# Altium footprint library IND_SMD.PcbLib: 118 footprints (part 8 of 8)
Each footprint in its own frame and in the unit in brackets; x right, y up, seen from the top. Pads: shape width x height; smd on the part's side, far side on the other; paste and mask are expansions set on the pad; w line width, h text height; cw(c..) or ccw(c..) is an arc to the next point about the centre after c.
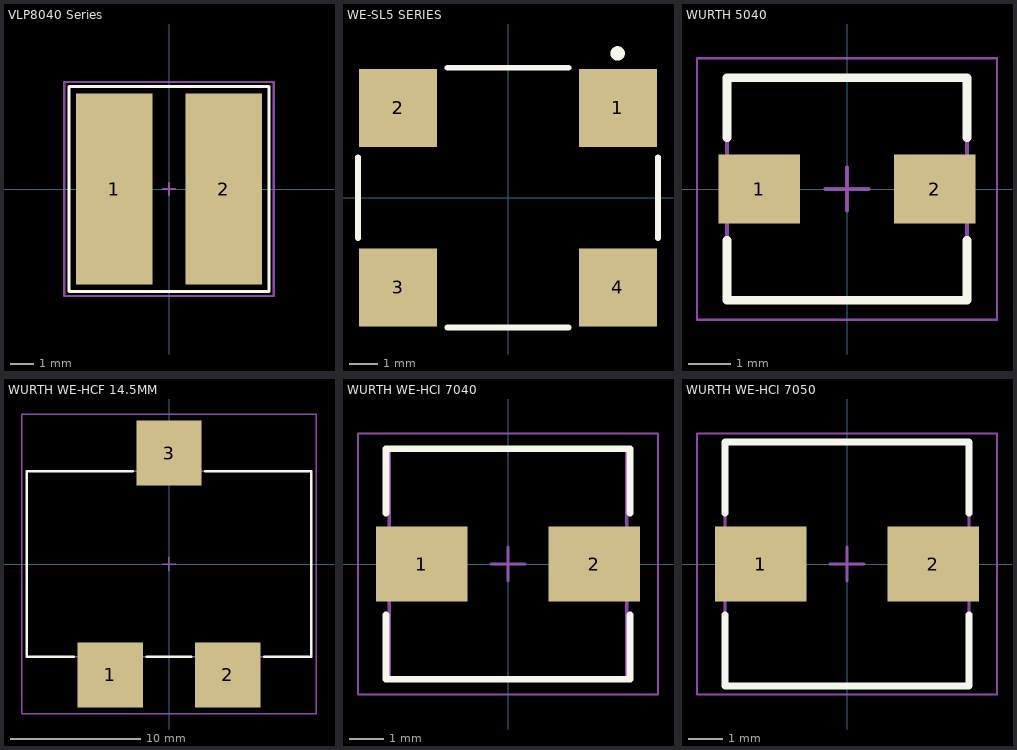
[diagram p7: the footprints below, top view; thin cyan lines are the x and y axes]

## VLP8040 Series [mm]
height 4
pads (2):
  rect 3.3x8.2 smd: 1(-2.35,0) 2(2.35,0)
Top Overlay:
  lines w0.127: -4.3,-4.4 4.3,-4.4 4.3,4.4 -4.3,4.4 -4.3,-4.4
Mechanical 15:
  lines w0.1: -0.25,0 0.25,0 ; 0,-0.25 0,0.25 ; -4.5,-4.6 4.5,-4.6 4.5,4.6 -4.5,4.6 -4.5,-4.6
3D body "VLP8040T.STEP": height 4.2, standoff 0, extent -3.75,-3.95 3.75,3.95

## WE-SL5 SERIES [mm]
pads (4):
  rect 2.7x2.7 smd: 1(3.81,3.11) 2(-3.81,3.11) 3(-3.81,-3.11) 4(3.81,-3.11)
Top Overlay:
  circle w0.3: c3.8,5 r0.1
  lines w0.2: -5.2,-1.4 -5.2,1.4 ; -2.1,-4.5 2.1,-4.5 ; -2.1,4.5 2.1,4.5 ; 5.2,-1.4 5.2,1.4
3D body "744272251.stp": height 6, standoff 0, extent -5,-4.35 5,4.35

## WURTH 5040 [mm] "Wire Wound Inductor, 2-Leads, Body 5.60x5.30mm, IPC Medium Density"
height 4.3
pads (2):
  rect 1.9x1.6 smd: 1(-2.05,0) 2(2.05,0)
Top Overlay:
  lines w0.2: -2.8,-1.2 -2.8,-2.6 2.8,-2.6 2.8,-1.2 ; -2.8,1.2 -2.8,2.6 2.8,2.6 2.8,1.2
Mechanical 13:
  lines w0.1: -2.8,-2.6 -2.8,2.6 2.8,2.6 2.8,-2.6 -2.8,-2.6
Mechanical 15:
  lines w0.05: -3.5,-3.05 -3.5,3.05 3.5,3.05 3.5,-3.05 -3.5,-3.05
  lines w0.1: -0.5,0 0.5,0 ; 0,-0.5 0,0.5
3D body "WE-HCI 5040.STEP": height 4, standoff 0, extent -2.79,-2.65 2.79,2.65

## WURTH WE-HCF 14.5MM [mm] "SMD High Current Inductor, body 21.8x14.2mm"
height 14.5
pads (3):
  rect 5x5 smd: 1(-4.5,-8.5) 2(4.5,-8.5) 3(0,8.5)
Top Overlay:
  lines w0.2: -7.3,-7.1 -10.9,-7.1 -10.9,7.1 -2.8,7.1 ; -1.7,-7.1 1.7,-7.1 ; 2.8,7.1 10.9,7.1 10.9,-7.1 7.3,-7.1
Mechanical 13:
  lines w0.1: -10.9,-7.1 -10.9,7.1 10.9,7.1 10.9,-7.1 -10.9,-7.1
Mechanical 15:
  lines w0.1: -0.5,0 0.5,0 ; 0,-0.5 0,0.5 ; -11.3,-11.5 -11.3,11.5 11.3,11.5 11.3,-11.5 -11.3,-11.5
3D body "WURTH WE-HCF 14.5mm.step": height 14, standoff 0, extent -10.75,-10.6 10.75,10.4

## WURTH WE-HCI 7040 [mm]
height 4
pads (2):
  rect 2.7x2.2 smd: 1(-2.55,0) 2(2.55,0)
Top Overlay:
  lines w0.2: -3.6,-1.5 -3.6,-3.4 3.6,-3.4 3.6,-1.5 ; -3.6,1.5 -3.6,3.4 3.6,3.4 3.6,1.5
Mechanical 13:
  lines w0.1: -3.5,-3.4 -3.5,3.4 3.5,3.4 3.5,-3.4 -3.5,-3.4
Mechanical 15:
  lines w0.05: -4.425,-3.85 -4.425,3.85 4.425,3.85 4.425,-3.85 -4.425,-3.85
  lines w0.1: -0.5,0 0.5,0 ; 0,-0.5 0,0.5
3D body "WE-HCI 7040.STEP": height 4, standoff 0, extent -3.49,-3.45 3.49,3.45

## WURTH WE-HCI 7050 [mm]
height 5
pads (2):
  rect 2.7x2.2 smd: 1(-2.55,0) 2(2.55,0)
Top Overlay:
  lines w0.2: -3.6,-1.5 -3.6,-3.6 3.6,-3.6 3.6,-1.5 ; -3.6,1.5 -3.6,3.6 3.6,3.6 3.6,1.5
Mechanical 13:
  lines w0.1: -3.6,-3.6 -3.6,3.6 3.6,3.6 3.6,-3.6 -3.6,-3.6
Mechanical 15:
  lines w0.05: -4.425,-3.85 -4.425,3.85 4.425,3.85 4.425,-3.85 -4.425,-3.85
  lines w0.1: -0.5,0 0.5,0 ; 0,-0.5 0,0.5
3D body "WE-HCI 7050.STEP": height 5, standoff 0, extent -3.49,-3.45 3.49,3.45